# Altium footprint library STM32F0.PcbLib: 228 footprints (part 4 of 16)
Each footprint in its own frame and in the unit in brackets; x right, y up, seen from the top. Pads: shape width x height; smd on the part's side, far side on the other; paste and mask are expansions set on the pad; w line width, h text height; cw(c..) or ccw(c..) is an arc to the next point about the centre after c.
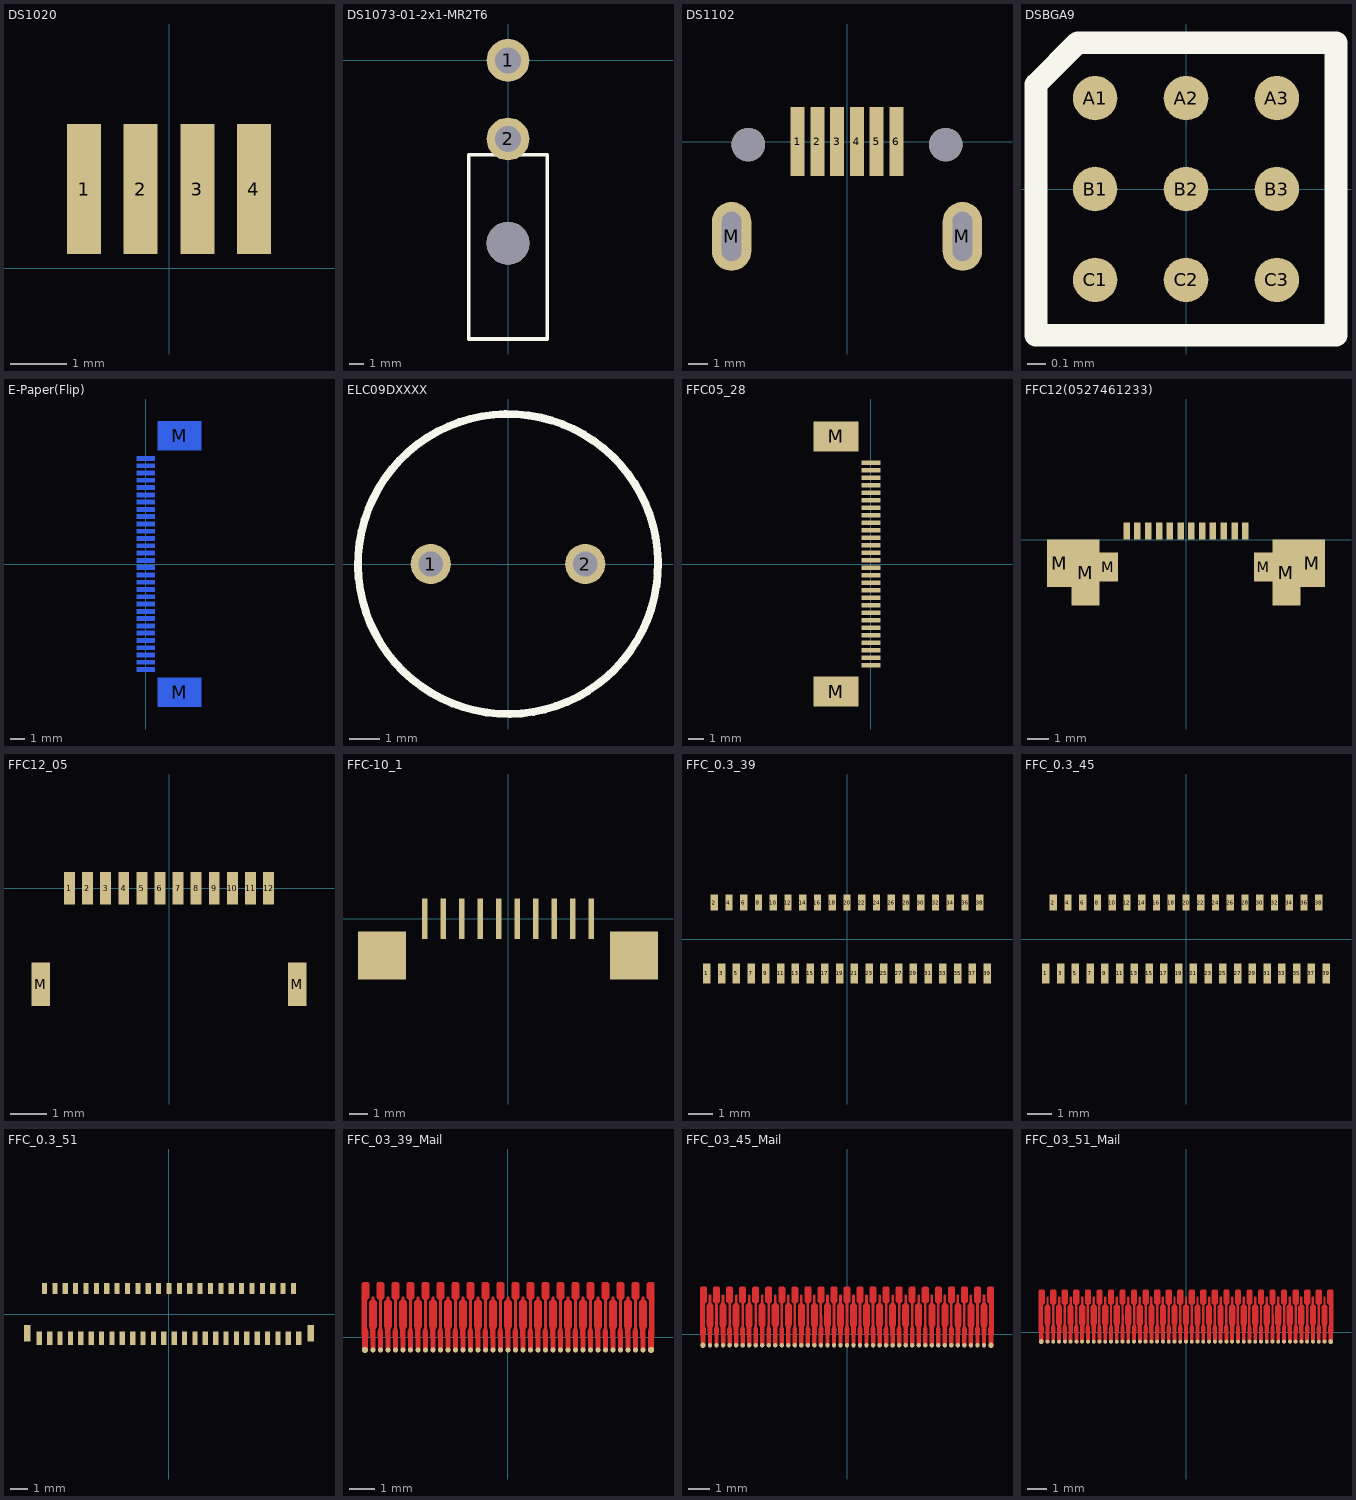
[diagram p3: the footprints below, top view; thin cyan lines are the x and y axes]

## DS1020 [mm]
pads (4):
  rect 0.6x2.3 smd: 1(-1.5,1.4) 2(-0.5,1.4) 3(0.5,1.4) 4(1.5,1.4)
3D body "DS1020.STEP": height 2.8, standoff 0, extent -3,-3.95 3,2.45

## DS1073-01-2x1-MR2T6 [mm]
pads (3):
  round 3 hole 1.8: 1(0,0) 2(0,-5.5)
  round 3 hole 3 unplated: ""(0,-12.8)
Top Overlay:
  lines w0.254: -2.75,-19.5 2.75,-19.5 2.75,-6.6 -2.75,-6.6 -2.75,-19.5

## DS1102 [mm]
pads (10):
  rect 0.7x3.5 smd: 1(-2.5,0) 2(-1.5,0) 3(-0.5,0) 4(0.5,0) 5(1.5,0) 6(2.5,0)
  oval 2x3.5 hole 1 slot 2.5 at 90 deg: M(-5.85,-4.8) M(5.85,-4.8)
  round 1.7 hole 1.7 unplated: ""(-5,-0.15) ""(5,-0.15)
3D body "53462-0629.stp": height 8.7, standoff -3.15, extent -6.75,-15.601 6.75,0.599

## DSBGA9 [mm]
pads (9):
  round 0.245 smd mask+0.05: A1(-0.5,0.5) A2(0,0.5) A3(0.5,0.5) B1(-0.5,0) B2(0,0) B3(0.5,0) C1(-0.5,-0.5) C2(0,-0.5) C3(0.5,-0.5)
Top Overlay:
  lines w0.125: -0.825,-0.805 -0.825,0.575 -0.595,0.805 0.825,0.805 0.825,-0.805 -0.825,-0.805

## E-Paper(Flip) [mm]
pads (32):
  rect 1.25x0.3 smd far side: 1(0,-7.25) 2(0,-6.75) 3(0,-6.25) 4(0,-5.75) 5(0,-5.25) 6(0,-4.75) 7(0,-4.25) 8(0,-3.75) 9(0,-3.25) 10(0,-2.75) 11(0,-2.25) 12(0,-1.75) 13(0,-1.25) 14(0,-0.75) 15(0,-0.25) 16(0,0.25) 17(0,0.75) 18(0,1.25) 19(0,1.75) 20(0,2.25) 21(0,2.75) 22(0,3.25) 23(0,3.75) 24(0,4.25) 25(0,4.75) 26(0,5.25) 27(0,5.75) 28(0,6.25) 29(0,6.75) 30(0,7.25)
  rect 3x2 smd far side: M(2.325,-8.8) M(2.325,8.8)
3D body "EPaperAsm1.STEP": height 1.48, standoff -2.23, extent -25.285,-9.3 8.225,9.3

## ELC09DXXXX [mm]
pads (2):
  round 1.3 hole 0.8: 1(-2.5,0) 2(2.5,0)
Top Overlay:
  lines w0.254: 4.857,0.099 ccw(c0,0) 4.858,0.05
3D body "User Library-COIL-ELC.step": height 8.9, standoff -3.1, extent -4.75,-4.75 4.75,4.75

## FFC05_28 [mm]
pads (30):
  rect 1.25x0.3 smd: 1(0,-6.75) 2(0,-6.25) 3(0,-5.75) 4(0,-5.25) 5(0,-4.75) 6(0,-4.25) 7(0,-3.75) 8(0,-3.25) 9(0,-2.75) 10(0,-2.25) 11(0,-1.75) 12(0,-1.25) 13(0,-0.75) 14(0,-0.25) 15(0,0.25) 16(0,0.75) 17(0,1.25) 18(0,1.75) 19(0,2.25) 20(0,2.75) 21(0,3.25) 22(0,3.75) 23(0,4.25) 24(0,4.75) 25(0,5.25) 26(0,5.75) 27(0,6.25) 28(0,6.75)
  rect 3x2 smd: M(-2.325,-8.52) M(-2.325,8.52)

## FFC12(0527461233) [mm] "Molex 0527461233"
pads (18):
  rect 0.3x0.8 smd: 1(-2.75,0.4) 2(-2.25,0.4) 3(-1.75,0.4) 4(-1.25,0.4) 5(-0.75,0.4) 6(-0.25,0.4) 7(0.25,0.4) 8(0.75,0.4) 9(1.25,0.4) 10(1.75,0.4) 11(2.25,0.4) 12(2.75,0.4)
  rect 1.2x2.2 smd: M(-5.85,-1.1) M(5.85,-1.1)
  rect 1.3x3.05 smd: M(-4.65,-1.525) M(4.65,-1.525)
  rect 0.9x1.34 smd: M(-3.6,-1.27) M(3.6,-1.27)
3D body "52746-1290.stp": height 2, standoff 0, extent -6.05,-5.9 6.05,0.7

## FFC12_05 [mm]
pads (14):
  rect 0.3x0.9 smd: 1(-2.75,0) 2(-2.25,0) 3(-1.75,0) 4(-1.25,0) 5(-0.75,0) 6(-0.25,0) 7(0.25,0) 8(0.75,0) 9(1.25,0) 10(1.75,0) 11(2.25,0) 12(2.75,0)
  rect 0.5x1.2 smd: M(-3.54,-2.65) M(3.54,-2.65)
3D body "5034801200.stp": height 1.85, standoff -0.02, extent -3.85,-3.25 3.85,0.35

## FFC-10_1 [mm]
pads (12):
  rect 0.3x2.2 smd: 1(-4.5,0) 2(-3.5,0) 3(-2.5,0) 4(-1.5,0) 5(-0.5,0) 6(0.5,0) 7(1.5,0) 8(2.5,0) 9(3.5,0) 10(4.5,0)
  rect 2.6x2.6 smd: ""(-6.8,-2) ""(6.8,-2)

## FFC_0.3_39 [mm]
pads (39):
  rect 0.3x0.8 smd: 1(-5.7,-1.4) 3(-5.1,-1.4) 5(-4.5,-1.4) 7(-3.9,-1.4) 9(-3.3,-1.4) 11(-2.7,-1.4) 13(-2.1,-1.4) 15(-1.5,-1.4) 17(-0.9,-1.4) 19(-0.3,-1.4) 21(0.3,-1.4) 23(0.9,-1.4) 25(1.5,-1.4) 27(2.1,-1.4) 29(2.7,-1.4) 31(3.3,-1.4) 33(3.9,-1.4) 35(4.5,-1.4) 37(5.1,-1.4) 39(5.7,-1.4)
  rect 0.3x0.65 smd: 2(-5.4,1.475) 4(-4.8,1.475) 6(-4.2,1.475) 8(-3.6,1.475) 10(-3,1.475) 12(-2.4,1.475) 14(-1.8,1.475) 16(-1.2,1.475) 18(-0.6,1.475) 20(0,1.475) 22(0.6,1.475) 24(1.2,1.475) 26(1.8,1.475) 28(2.4,1.475) 30(3,1.475) 32(3.6,1.475) 34(4.2,1.475) 36(4.8,1.475) 38(5.4,1.475)
3D body "5047403900.stp": height 1.62, standoff -0.03, extent -6.4,-1.7 6.4,1.75

## FFC_0.3_45 [mm]
pads (39):
  rect 0.3x0.8 smd: 1(-5.7,-1.4) 3(-5.1,-1.4) 5(-4.5,-1.4) 7(-3.9,-1.4) 9(-3.3,-1.4) 11(-2.7,-1.4) 13(-2.1,-1.4) 15(-1.5,-1.4) 17(-0.9,-1.4) 19(-0.3,-1.4) 21(0.3,-1.4) 23(0.9,-1.4) 25(1.5,-1.4) 27(2.1,-1.4) 29(2.7,-1.4) 31(3.3,-1.4) 33(3.9,-1.4) 35(4.5,-1.4) 37(5.1,-1.4) 39(5.7,-1.4)
  rect 0.3x0.65 smd: 2(-5.4,1.475) 4(-4.8,1.475) 6(-4.2,1.475) 8(-3.6,1.475) 10(-3,1.475) 12(-2.4,1.475) 14(-1.8,1.475) 16(-1.2,1.475) 18(-0.6,1.475) 20(0,1.475) 22(0.6,1.475) 24(1.2,1.475) 26(1.8,1.475) 28(2.4,1.475) 30(3,1.475) 32(3.6,1.475) 34(4.2,1.475) 36(4.8,1.475) 38(5.4,1.475)
3D body "5047403900.stp": height 1.62, standoff -0.03, extent -6.4,-1.7 6.4,1.75

## FFC_0.3_51 [mm]
pads (53):
  rect 0.3x0.8 smd: 1(-7.5,-1.4) 3(-6.9,-1.4) 5(-6.3,-1.4) 7(-5.7,-1.4) 9(-5.1,-1.4) 11(-4.5,-1.4) 13(-3.9,-1.4) 15(-3.3,-1.4) 17(-2.7,-1.4) 19(-2.1,-1.4) 21(-1.5,-1.4) 23(-0.9,-1.4) 25(-0.3,-1.4) 27(0.3,-1.4) 29(0.9,-1.4) 31(1.5,-1.4) 33(2.1,-1.4) 35(2.7,-1.4) 37(3.3,-1.4) 39(3.9,-1.4) 41(4.5,-1.4) 43(5.1,-1.4) 45(5.7,-1.4) 47(6.3,-1.4) 49(6.9,-1.4) 51(7.5,-1.4)
  rect 0.3x0.65 smd: 2(-7.2,1.475) 4(-6.6,1.475) 6(-6,1.475) 8(-5.4,1.475) 10(-4.8,1.475) 12(-4.2,1.475) 14(-3.6,1.475) 16(-3,1.475) 18(-2.4,1.475) 20(-1.8,1.475) 22(-1.2,1.475) 24(-0.6,1.475) 26(0,1.475) 28(0.6,1.475) 30(1.2,1.475) 32(1.8,1.475) 34(2.4,1.475) 36(3,1.475) 38(3.6,1.475) 40(4.2,1.475) 42(4.8,1.475) 44(5.4,1.475) 46(6,1.475) 48(6.6,1.475) 50(7.2,1.475)
  rect 0.4x0.95 smd: M(-8.2,-1.125) M(8.2,-1.125)
3D body "fh26w-51s-0_3shw_99_.stp": height 1.01, standoff 0.01, extent -8.4,-1.905 8.4,1.595

## FFC_03_39_Mail [mm]
pads (39):
  round 0.25 smd paste-1: 1(5.725,-0.5)
  round 0.2 smd paste-1: 2(5.4,-0.5) 3(5.1,-0.5) 4(4.8,-0.5) 5(4.5,-0.5) 6(4.2,-0.5) 7(3.9,-0.5) 8(3.6,-0.5) 9(3.3,-0.5) 10(3,-0.5) 11(2.7,-0.5) 12(2.4,-0.5) 13(2.1,-0.5) 14(1.8,-0.5) 15(1.5,-0.5) 16(1.2,-0.5) 17(0.9,-0.5) 18(0.6,-0.5) 19(0.3,-0.5) 20(0,-0.5) 21(-0.3,-0.5) 22(-0.6,-0.5) 23(-0.9,-0.5) 24(-1.2,-0.5) 25(-1.5,-0.5) 26(-1.8,-0.5) 27(-2.1,-0.5) 28(-2.4,-0.5) 29(-2.7,-0.5) 30(-3,-0.5) 31(-3.3,-0.5) 32(-3.6,-0.5) 33(-3.9,-0.5) 34(-4.2,-0.5) 35(-4.5,-0.5) 36(-4.8,-0.5) 37(-5.1,-0.5) 38(-5.4,-0.5)
  round 0.25 smd paste-10: 39(-5.725,-0.5)
Top Layer:
  region: -5,0 -5.2,0 -5.2,0.25 -5.15,0.4 -5.15,1.48 -5.25,1.58 -5.25,2.15 -5.2,2.2 -5,2.2 -4.95,2.15 -4.95,1.58 -5.05,1.48 -5.05,0.4 -5,0.25
  region: -4.4,0 -4.6,0 -4.6,0.25 -4.55,0.4 -4.55,1.48 -4.65,1.58 -4.65,2.15 -4.6,2.2 -4.4,2.2 -4.35,2.15 -4.35,1.58 -4.45,1.48 -4.45,0.4 -4.4,0.25
  region: -3.8,0 -4,0 -4,0.25 -3.95,0.4 -3.95,1.48 -4.05,1.58 -4.05,2.15 -4,2.2 -3.8,2.2 -3.75,2.15 -3.75,1.58 -3.85,1.48 -3.85,0.4 -3.8,0.25
  region: -0.8,0 -1,0 -1,0.25 -0.95,0.4 -0.95,1.48 -1.05,1.58 -1.05,2.15 -1,2.2 -0.8,2.2 -0.75,2.15 -0.75,1.58 -0.85,1.48 -0.85,0.4 -0.8,0.25
  region: -1.4,0 -1.6,0 -1.6,0.25 -1.55,0.4 -1.55,1.48 -1.65,1.58 -1.65,2.15 -1.6,2.2 -1.4,2.2 -1.35,2.15 -1.35,1.58 -1.45,1.48 -1.45,0.4 -1.4,0.25
  region: -2,0 -2.2,0 -2.2,0.25 -2.15,0.4 -2.15,1.48 -2.25,1.58 -2.25,2.15 -2.2,2.2 -2,2.2 -1.95,2.15 -1.95,1.58 -2.05,1.48 -2.05,0.4 -2,0.25
  region: -2.6,0 -2.8,0 -2.8,0.25 -2.75,0.4 -2.75,1.48 -2.85,1.58 -2.85,2.15 -2.8,2.2 -2.6,2.2 -2.55,2.15 -2.55,1.58 -2.65,1.48 -2.65,0.4 -2.6,0.25
  region: -3.2,0 -3.4,0 -3.4,0.25 -3.35,0.4 -3.35,1.48 -3.45,1.58 -3.45,2.15 -3.4,2.2 -3.2,2.2 -3.15,2.15 -3.15,1.58 -3.25,1.48 -3.25,0.4 -3.2,0.25
  region: 2.2,0 2,0 2,0.25 2.05,0.4 2.05,1.48 1.95,1.58 1.95,2.15 2,2.2 2.2,2.2 2.25,2.15 2.25,1.58 2.15,1.48 2.15,0.4 2.2,0.25
  region: 1.6,0 1.4,0 1.4,0.25 1.45,0.4 1.45,1.48 1.35,1.58 1.35,2.15 1.4,2.2 1.6,2.2 1.65,2.15 1.65,1.58 1.55,1.48 1.55,0.4 1.6,0.25
  region: 1,0 0.8,0 0.8,0.25 0.85,0.4 0.85,1.48 0.75,1.58 0.75,2.15 0.8,2.2 1,2.2 1.05,2.15 1.05,1.58 0.95,1.48 0.95,0.4 1,0.25
  region: 0.4,0 0.2,0 0.2,0.25 0.25,0.4 0.25,1.48 0.15,1.58 0.15,2.15 0.2,2.2 0.4,2.2 0.45,2.15 0.45,1.58 0.35,1.48 0.35,0.4 0.4,0.25
  region: -0.2,0 -0.4,0 -0.4,0.25 -0.35,0.4 -0.35,1.48 -0.45,1.58 -0.45,2.15 -0.4,2.2 -0.2,2.2 -0.15,2.15 -0.15,1.58 -0.25,1.48 -0.25,0.4 -0.2,0.25
  region: 2.8,0 2.6,0 2.6,0.25 2.65,0.4 2.65,1.48 2.55,1.58 2.55,2.15 2.6,2.2 2.8,2.2 2.85,2.15 2.85,1.58 2.75,1.48 2.75,0.4 2.8,0.25
  region: 3.4,0 3.2,0 3.2,0.25 3.25,0.4 3.25,1.48 3.15,1.58 3.15,2.15 3.2,2.2 3.4,2.2 3.45,2.15 3.45,1.58 3.35,1.48 3.35,0.4 3.4,0.25
  region: 4,0 3.8,0 3.8,0.25 3.85,0.4 3.85,1.48 3.75,1.58 3.75,2.15 3.8,2.2 4,2.2 4.05,2.15 4.05,1.58 3.95,1.48 3.95,0.4 4,0.25
  region: 4.6,0 4.4,0 4.4,0.25 4.45,0.4 4.45,1.48 4.35,1.58 4.35,2.15 4.4,2.2 4.6,2.2 4.65,2.15 4.65,1.58 4.55,1.48 4.55,0.4 4.6,0.25
  region: 4.7,0 4.7,0.3 4.65,0.45 4.65,1.43 4.75,1.53 4.75,1.61 4.77,1.63 4.83,1.63 4.85,1.61 4.85,1.53 4.95,1.43 4.95,0.45 4.9,0.3 4.9,0
  region: 4.1,0 4.1,0.3 4.05,0.45 4.05,1.43 4.15,1.53 4.15,1.61 4.17,1.63 4.23,1.63 4.25,1.61 4.25,1.53 4.35,1.43 4.35,0.45 4.3,0.3 4.3,0
  region: -0.7,0 -0.7,0.3 -0.75,0.45 -0.75,1.43 -0.65,1.53 -0.65,1.61 -0.63,1.63 -0.57,1.63 -0.55,1.61 -0.55,1.53 -0.45,1.43 -0.45,0.45 -0.5,0.3 -0.5,0
  region: -0.1,0 -0.1,0.3 -0.15,0.45 -0.15,1.43 -0.05,1.53 -0.05,1.61 -0.03,1.63 0.03,1.63 0.05,1.61 0.05,1.53 0.15,1.43 0.15,0.45 0.1,0.3 0.1,0
  region: 0.5,0 0.5,0.3 0.45,0.45 0.45,1.43 0.55,1.53 0.55,1.61 0.57,1.63 0.63,1.63 0.65,1.61 0.65,1.53 0.75,1.43 0.75,0.45 0.7,0.3 0.7,0
  region: 1.1,0 1.1,0.3 1.05,0.45 1.05,1.43 1.15,1.53 1.15,1.61 1.17,1.63 1.23,1.63 1.25,1.61 1.25,1.53 1.35,1.43 1.35,0.45 1.3,0.3 1.3,0
  region: 1.7,0 1.7,0.3 1.65,0.45 1.65,1.43 1.75,1.53 1.75,1.61 1.77,1.63 1.83,1.63 1.85,1.61 1.85,1.53 1.95,1.43 1.95,0.45 1.9,0.3 1.9,0
  region: 2.3,0 2.3,0.3 2.25,0.45 2.25,1.43 2.35,1.53 2.35,1.61 2.37,1.63 2.43,1.63 2.45,1.61 2.45,1.53 2.55,1.43 2.55,0.45 2.5,0.3 2.5,0
  region: 2.9,0 2.9,0.3 2.85,0.45 2.85,1.43 2.95,1.53 2.95,1.61 2.97,1.63 3.03,1.63 3.05,1.61 3.05,1.53 3.15,1.43 3.15,0.45 3.1,0.3 3.1,0
  region: 3.5,0 3.5,0.3 3.45,0.45 3.45,1.43 3.55,1.53 3.55,1.61 3.57,1.63 3.63,1.63 3.65,1.61 3.65,1.53 3.75,1.43 3.75,0.45 3.7,0.3 3.7,0
  region: -1.3,0 -1.3,0.3 -1.35,0.45 -1.35,1.43 -1.25,1.53 -1.25,1.61 -1.23,1.63 -1.17,1.63 -1.15,1.61 -1.15,1.53 -1.05,1.43 -1.05,0.45 -1.1,0.3 -1.1,0
  region: -1.9,0 -1.9,0.3 -1.95,0.45 -1.95,1.43 -1.85,1.53 -1.85,1.61 -1.83,1.63 -1.77,1.63 -1.75,1.61 -1.75,1.53 -1.65,1.43 -1.65,0.45 -1.7,0.3 -1.7,0
  region: -2.5,0 -2.5,0.3 -2.55,0.45 -2.55,1.43 -2.45,1.53 -2.45,1.61 -2.43,1.63 -2.37,1.63 -2.35,1.61 -2.35,1.53 -2.25,1.43 -2.25,0.45 -2.3,0.3 -2.3,0
  region: -3.1,0 -3.1,0.3 -3.15,0.45 -3.15,1.43 -3.05,1.53 -3.05,1.61 -3.03,1.63 -2.97,1.63 -2.95,1.61 -2.95,1.53 -2.85,1.43 -2.85,0.45 -2.9,0.3 -2.9,0
  region: -3.7,0 -3.7,0.3 -3.75,0.45 -3.75,1.43 -3.65,1.53 -3.65,1.61 -3.63,1.63 -3.57,1.63 -3.55,1.61 -3.55,1.53 -3.45,1.43 -3.45,0.45 -3.5,0.3 -3.5,0
  region: -4.3,0 -4.3,0.3 -4.35,0.45 -4.35,1.43 -4.25,1.53 -4.25,1.61 -4.23,1.63 -4.17,1.63 -4.15,1.61 -4.15,1.53 -4.05,1.43 -4.05,0.45 -4.1,0.3 -4.1,0
  region: -4.9,0 -4.9,0.3 -4.95,0.45 -4.95,1.43 -4.85,1.53 -4.85,1.61 -4.83,1.63 -4.77,1.63 -4.75,1.61 -4.75,1.53 -4.65,1.43 -4.65,0.45 -4.7,0.3 -4.7,0
  region: -5.5,0 -5.5,0.3 -5.55,0.45 -5.55,1.43 -5.45,1.53 -5.45,1.61 -5.43,1.63 -5.37,1.63 -5.35,1.61 -5.35,1.53 -5.25,1.43 -5.25,0.45 -5.3,0.3 -5.3,0
  region: 5.6,0 5.6,0.25 5.65,0.4 5.65,1.48 5.55,1.58 5.55,2.15 5.6,2.2 5.8,2.2 5.85,2.15 5.85,0
  region: 5.3,0 5.3,0.3 5.25,0.45 5.25,1.43 5.35,1.53 5.35,1.61 5.37,1.63 5.43,1.63 5.45,1.61 5.45,1.53 5.55,1.43 5.55,0.45 5.5,0.3 5.5,0
  region: 5.2,0 5,0 5,0.25 5.05,0.4 5.05,1.48 4.95,1.58 4.95,2.15 5,2.2 5.2,2.2 5.25,2.15 5.25,1.58 5.15,1.48 5.15,0.4 5.2,0.25
  region: -5.6,0 -5.85,0 -5.85,2.15 -5.8,2.2 -5.6,2.2 -5.55,2.15 -5.55,1.58 -5.65,1.48 -5.65,0.4 -5.6,0.25
  lines w0.2: -5.4,-0.5 -5.4,0 ; -5.1,-0.5 -5.1,0 ; -4.8,-0.5 -4.8,0 ; -4.5,-0.5 -4.5,0 ; -4.2,-0.5 -4.2,0 ; -3.9,-0.5 -3.9,0 ; -3.6,-0.5 -3.6,0 ; -3.3,-0.5 -3.3,0 ; -3,-0.5 -3,0 ; -2.7,-0.5 -2.7,0 ; -2.4,-0.5 -2.4,0 ; -2.1,-0.5 -2.1,0 ; -1.8,-0.5 -1.8,0 ; -1.5,-0.5 -1.5,0 ; -1.2,-0.5 -1.2,0 ; -0.9,-0.5 -0.9,0 ; -0.6,-0.5 -0.6,0 ; -0.3,-0.5 -0.3,0 ; 0,-0.5 0,0 ; 0.3,-0.5 0.3,0 ; 0.6,-0.5 0.6,0 ; 0.9,-0.5 0.9,0 ; 1.2,-0.5 1.2,0 ; 1.5,-0.5 1.5,0 ; 1.8,-0.5 1.8,0 ; 2.1,-0.5 2.1,0 ; 2.4,-0.5 2.4,0 ; 2.7,-0.5 2.7,0 ; 3,-0.5 3,0 ; 3.3,-0.5 3.3,0 ; 3.6,-0.5 3.6,0 ; 3.9,-0.5 3.9,0 ; 4.2,-0.5 4.2,0 ; 4.5,-0.5 4.5,0 ; 4.8,-0.5 4.8,0 ; 5.1,-0.5 5.1,0 ; 5.4,-0.5 5.4,0
  lines w0.25: -5.725,-0.5 -5.725,0 ; 5.725,-0.5 5.725,0
Top Solder:
  rectangle: -6,0 6,2.5

## FFC_03_45_Mail [mm]
pads (45):
  round 0.25 smd paste-1: 1(6.625,-0.5)
  round 0.2 smd paste-1: 2(6.3,-0.5) 3(6,-0.5) 4(5.7,-0.5) 5(5.4,-0.5) 6(5.1,-0.5) 7(4.8,-0.5) 8(4.5,-0.5) 9(4.2,-0.5) 10(3.9,-0.5) 11(3.6,-0.5) 12(3.3,-0.5) 13(3,-0.5) 14(2.7,-0.5) 15(2.4,-0.5) 16(2.1,-0.5) 17(1.8,-0.5) 18(1.5,-0.5) 19(1.2,-0.5) 20(0.9,-0.5) 21(0.6,-0.5) 22(0.3,-0.5) 23(0,-0.5) 24(-0.3,-0.5) 25(-0.6,-0.5) 26(-0.9,-0.5) 27(-1.2,-0.5) 28(-1.5,-0.5) 29(-1.8,-0.5) 30(-2.1,-0.5) 31(-2.4,-0.5) 32(-2.7,-0.5) 33(-3,-0.5) 34(-3.3,-0.5) 35(-3.6,-0.5) 36(-3.9,-0.5) 37(-4.2,-0.5) 38(-4.5,-0.5) 39(-4.8,-0.5) 40(-5.1,-0.5) 41(-5.4,-0.5) 42(-5.7,-0.5) 43(-6,-0.5) 44(-6.3,-0.5)
  round 0.25 smd paste-10: 45(-6.625,-0.5)
Top Layer:
  region: 6.5,0 6.5,0.25 6.55,0.4 6.55,1.4 6.45,1.5 6.45,2.15 6.5,2.2 6.7,2.2 6.75,2.15 6.75,0
  region: -1.7,0 -1.9,0 -1.9,0.25 -1.85,0.4 -1.85,1.4 -1.95,1.5 -1.95,2.15 -1.9,2.2 -1.7,2.2 -1.65,2.15 -1.65,1.5 -1.75,1.4 -1.75,0.4 -1.7,0.25
  region: 6.2,0 6.2,0.3 6.15,0.45 6.15,1.35 6.25,1.45 6.25,1.8 6.275,1.825 6.325,1.825 6.35,1.8 6.35,1.45 6.45,1.35 6.45,0.45 6.4,0.3 6.4,0
  region: 5.6,0 5.6,0.3 5.55,0.45 5.55,1.35 5.65,1.45 5.65,1.8 5.675,1.825 5.725,1.825 5.75,1.8 5.75,1.45 5.85,1.35 5.85,0.45 5.8,0.3 5.8,0
  region: 5,0 5,0.3 4.95,0.45 4.95,1.35 5.05,1.45 5.05,1.8 5.075,1.825 5.125,1.825 5.15,1.8 5.15,1.45 5.25,1.35 5.25,0.45 5.2,0.3 5.2,0
  region: 4.4,0 4.4,0.3 4.35,0.45 4.35,1.35 4.45,1.45 4.45,1.8 4.475,1.825 4.525,1.825 4.55,1.8 4.55,1.45 4.65,1.35 4.65,0.45 4.6,0.3 4.6,0
  region: 3.8,0 3.8,0.3 3.75,0.45 3.75,1.35 3.85,1.45 3.85,1.8 3.875,1.825 3.925,1.825 3.95,1.8 3.95,1.45 4.05,1.35 4.05,0.45 4,0.3 4,0
  region: 3.2,0 3.2,0.3 3.15,0.45 3.15,1.35 3.25,1.45 3.25,1.8 3.275,1.825 3.325,1.825 3.35,1.8 3.35,1.45 3.45,1.35 3.45,0.45 3.4,0.3 3.4,0
  region: 3.1,0 2.9,0 2.9,0.25 2.95,0.4 2.95,1.4 2.85,1.5 2.85,2.15 2.9,2.2 3.1,2.2 3.15,2.15 3.15,1.5 3.05,1.4 3.05,0.4 3.1,0.25
  region: 3.7,0 3.5,0 3.5,0.25 3.55,0.4 3.55,1.4 3.45,1.5 3.45,2.15 3.5,2.2 3.7,2.2 3.75,2.15 3.75,1.5 3.65,1.4 3.65,0.4 3.7,0.25
  region: 6.1,0 5.9,0 5.9,0.25 5.95,0.4 5.95,1.4 5.85,1.5 5.85,2.15 5.9,2.2 6.1,2.2 6.15,2.15 6.15,1.5 6.05,1.4 6.05,0.4 6.1,0.25
  region: 5.5,0 5.3,0 5.3,0.25 5.35,0.4 5.35,1.4 5.25,1.5 5.25,2.15 5.3,2.2 5.5,2.2 5.55,2.15 5.55,1.5 5.45,1.4 5.45,0.4 5.5,0.25
  region: 4.9,0 4.7,0 4.7,0.25 4.75,0.4 4.75,1.4 4.65,1.5 4.65,2.15 4.7,2.2 4.9,2.2 4.95,2.15 4.95,1.5 4.85,1.4 4.85,0.4 4.9,0.25
  region: 4.3,0 4.1,0 4.1,0.25 4.15,0.4 4.15,1.4 4.05,1.5 4.05,2.15 4.1,2.2 4.3,2.2 4.35,2.15 4.35,1.5 4.25,1.4 4.25,0.4 4.3,0.25
  region: 0.7,0 0.5,0 0.5,0.25 0.55,0.4 0.55,1.4 0.45,1.5 0.45,2.15 0.5,2.2 0.7,2.2 0.75,2.15 0.75,1.5 0.65,1.4 0.65,0.4 0.7,0.25
  region: 1.3,0 1.1,0 1.1,0.25 1.15,0.4 1.15,1.4 1.05,1.5 1.05,2.15 1.1,2.2 1.3,2.2 1.35,2.15 1.35,1.5 1.25,1.4 1.25,0.4 1.3,0.25
  region: 1.9,0 1.7,0 1.7,0.25 1.75,0.4 1.75,1.4 1.65,1.5 1.65,2.15 1.7,2.2 1.9,2.2 1.95,2.15 1.95,1.5 1.85,1.4 1.85,0.4 1.9,0.25
  region: 2.5,0 2.3,0 2.3,0.25 2.35,0.4 2.35,1.4 2.25,1.5 2.25,2.15 2.3,2.2 2.5,2.2 2.55,2.15 2.55,1.5 2.45,1.4 2.45,0.4 2.5,0.25
  region: 0.1,0 -0.1,0 -0.1,0.25 -0.05,0.4 -0.05,1.4 -0.15,1.5 -0.15,2.15 -0.1,2.2 0.1,2.2 0.15,2.15 0.15,1.5 0.05,1.4 0.05,0.4 0.1,0.25
  region: -0.5,0 -0.7,0 -0.7,0.25 -0.65,0.4 -0.65,1.4 -0.75,1.5 -0.75,2.15 -0.7,2.2 -0.5,2.2 -0.45,2.15 -0.45,1.5 -0.55,1.4 -0.55,0.4 -0.5,0.25
  region: -1.1,0 -1.3,0 -1.3,0.25 -1.25,0.4 -1.25,1.4 -1.35,1.5 -1.35,2.15 -1.3,2.2 -1.1,2.2 -1.05,2.15 -1.05,1.5 -1.15,1.4 -1.15,0.4 -1.1,0.25
  region: -1,0 -1,0.3 -1.05,0.45 -1.05,1.35 -0.95,1.45 -0.95,1.8 -0.925,1.825 -0.875,1.825 -0.85,1.8 -0.85,1.45 -0.75,1.35 -0.75,0.45 -0.8,0.3 -0.8,0
  region: -0.4,0 -0.4,0.3 -0.45,0.45 -0.45,1.35 -0.35,1.45 -0.35,1.8 -0.325,1.825 -0.275,1.825 -0.25,1.8 -0.25,1.45 -0.15,1.35 -0.15,0.45 -0.2,0.3 -0.2,0
  region: 0.2,0 0.2,0.3 0.15,0.45 0.15,1.35 0.25,1.45 0.25,1.8 0.275,1.825 0.325,1.825 0.35,1.8 0.35,1.45 0.45,1.35 0.45,0.45 0.4,0.3 0.4,0
  region: 0.8,0 0.8,0.3 0.75,0.45 0.75,1.35 0.85,1.45 0.85,1.8 0.875,1.825 0.925,1.825 0.95,1.8 0.95,1.45 1.05,1.35 1.05,0.45 1,0.3 1,0
  region: 1.4,0 1.4,0.3 1.35,0.45 1.35,1.35 1.45,1.45 1.45,1.8 1.475,1.825 1.525,1.825 1.55,1.8 1.55,1.45 1.65,1.35 1.65,0.45 1.6,0.3 1.6,0
  region: 2,0 2,0.3 1.95,0.45 1.95,1.35 2.05,1.45 2.05,1.8 2.075,1.825 2.125,1.825 2.15,1.8 2.15,1.45 2.25,1.35 2.25,0.45 2.2,0.3 2.2,0
  region: 2.6,0 2.6,0.3 2.55,0.45 2.55,1.35 2.65,1.45 2.65,1.8 2.675,1.825 2.725,1.825 2.75,1.8 2.75,1.45 2.85,1.35 2.85,0.45 2.8,0.3 2.8,0
  region: -1.6,0 -1.6,0.3 -1.65,0.45 -1.65,1.35 -1.55,1.45 -1.55,1.8 -1.525,1.825 -1.475,1.825 -1.45,1.8 -1.45,1.45 -1.35,1.35 -1.35,0.45 -1.4,0.3 -1.4,0
  region: -4.1,0 -4.3,0 -4.3,0.25 -4.25,0.4 -4.25,1.4 -4.35,1.5 -4.35,2.15 -4.3,2.2 -4.1,2.2 -4.05,2.15 -4.05,1.5 -4.15,1.4 -4.15,0.4 -4.1,0.25
  region: -3.5,0 -3.7,0 -3.7,0.25 -3.65,0.4 -3.65,1.4 -3.75,1.5 -3.75,2.15 -3.7,2.2 -3.5,2.2 -3.45,2.15 -3.45,1.5 -3.55,1.4 -3.55,0.4 -3.5,0.25
  region: -2.9,0 -3.1,0 -3.1,0.25 -3.05,0.4 -3.05,1.4 -3.15,1.5 -3.15,2.15 -3.1,2.2 -2.9,2.2 -2.85,2.15 -2.85,1.5 -2.95,1.4 -2.95,0.4 -2.9,0.25
  region: -2.3,0 -2.5,0 -2.5,0.25 -2.45,0.4 -2.45,1.4 -2.55,1.5 -2.55,2.15 -2.5,2.2 -2.3,2.2 -2.25,2.15 -2.25,1.5 -2.35,1.4 -2.35,0.4 -2.3,0.25
  region: -4.7,0 -4.9,0 -4.9,0.25 -4.85,0.4 -4.85,1.4 -4.95,1.5 -4.95,2.15 -4.9,2.2 -4.7,2.2 -4.65,2.15 -4.65,1.5 -4.75,1.4 -4.75,0.4 -4.7,0.25
  region: -5.3,0 -5.5,0 -5.5,0.25 -5.45,0.4 -5.45,1.4 -5.55,1.5 -5.55,2.15 -5.5,2.2 -5.3,2.2 -5.25,2.15 -5.25,1.5 -5.35,1.4 -5.35,0.4 -5.3,0.25
  region: -5.9,0 -6.1,0 -6.1,0.25 -6.05,0.4 -6.05,1.4 -6.15,1.5 -6.15,2.15 -6.1,2.2 -5.9,2.2 -5.85,2.15 -5.85,1.5 -5.95,1.4 -5.95,0.4 -5.9,0.25
  region: -5.8,0 -5.8,0.3 -5.85,0.45 -5.85,1.35 -5.75,1.45 -5.75,1.8 -5.725,1.825 -5.675,1.825 -5.65,1.8 -5.65,1.45 -5.55,1.35 -5.55,0.45 -5.6,0.3 -5.6,0
  region: -5.2,0 -5.2,0.3 -5.25,0.45 -5.25,1.35 -5.15,1.45 -5.15,1.8 -5.125,1.825 -5.075,1.825 -5.05,1.8 -5.05,1.45 -4.95,1.35 -4.95,0.45 -5,0.3 -5,0
  region: -4.6,0 -4.6,0.3 -4.65,0.45 -4.65,1.35 -4.55,1.45 -4.55,1.8 -4.525,1.825 -4.475,1.825 -4.45,1.8 -4.45,1.45 -4.35,1.35 -4.35,0.45 -4.4,0.3 -4.4,0
  region: -4,0 -4,0.3 -4.05,0.45 -4.05,1.35 -3.95,1.45 -3.95,1.8 -3.925,1.825 -3.875,1.825 -3.85,1.8 -3.85,1.45 -3.75,1.35 -3.75,0.45 -3.8,0.3 -3.8,0
  region: -3.4,0 -3.4,0.3 -3.45,0.45 -3.45,1.35 -3.35,1.45 -3.35,1.8 -3.325,1.825 -3.275,1.825 -3.25,1.8 -3.25,1.45 -3.15,1.35 -3.15,0.45 -3.2,0.3 -3.2,0
  region: -2.8,0 -2.8,0.3 -2.85,0.45 -2.85,1.35 -2.75,1.45 -2.75,1.8 -2.725,1.825 -2.675,1.825 -2.65,1.8 -2.65,1.45 -2.55,1.35 -2.55,0.45 -2.6,0.3 -2.6,0
  region: -2.2,0 -2.2,0.3 -2.25,0.45 -2.25,1.35 -2.15,1.45 -2.15,1.8 -2.125,1.825 -2.075,1.825 -2.05,1.8 -2.05,1.45 -1.95,1.35 -1.95,0.45 -2,0.3 -2,0
  region: -6.4,0 -6.4,0.3 -6.45,0.45 -6.45,1.35 -6.35,1.45 -6.35,1.8 -6.325,1.825 -6.275,1.825 -6.25,1.8 -6.25,1.45 -6.15,1.35 -6.15,0.45 -6.2,0.3 -6.2,0
  region: -6.5,0 -6.75,0 -6.75,2.15 -6.7,2.2 -6.5,2.2 -6.45,2.15 -6.45,1.5 -6.55,1.4 -6.55,0.4 -6.5,0.25
  lines w0.2: -6.3,-0.5 -6.3,0 ; -6,-0.5 -6,0 ; -5.7,-0.5 -5.7,0 ; -5.4,-0.5 -5.4,0 ; -5.1,-0.5 -5.1,0 ; -4.8,-0.5 -4.8,0 ; -4.5,-0.5 -4.5,0 ; -4.2,-0.5 -4.2,0 ; -3.9,-0.5 -3.9,0 ; -3.6,-0.5 -3.6,0 ; -3.3,-0.5 -3.3,0 ; -3,-0.5 -3,0 ; -2.7,-0.5 -2.7,0 ; -2.4,-0.5 -2.4,0 ; -2.1,-0.5 -2.1,0 ; -1.8,-0.5 -1.8,0 ; -1.5,-0.5 -1.5,0 ; -1.2,-0.5 -1.2,0 ; -0.9,-0.5 -0.9,0 ; -0.6,-0.5 -0.6,0 ; -0.3,-0.5 -0.3,0 ; 0,-0.5 0,0 ; 0.3,-0.5 0.3,0 ; 0.6,-0.5 0.6,0 ; 0.9,-0.5 0.9,0 ; 1.2,-0.5 1.2,0 ; 1.5,-0.5 1.5,0 ; 1.8,-0.5 1.8,0 ; 2.1,-0.5 2.1,0 ; 2.4,-0.5 2.4,0 ; 2.7,-0.5 2.7,0 ; 3,-0.5 3,0 ; 3.3,-0.5 3.3,0 ; 3.6,-0.5 3.6,0 ; 3.9,-0.5 3.9,0 ; 4.2,-0.5 4.2,0 ; 4.5,-0.5 4.5,0 ; 4.8,-0.5 4.8,0 ; 5.1,-0.5 5.1,0 ; 5.4,-0.5 5.4,0 ; 5.7,-0.5 5.7,0 ; 6,-0.5 6,0 ; 6.3,-0.5 6.3,0
  lines w0.25: -6.625,-0.5 -6.625,0 ; 6.625,-0.5 6.625,0
Top Solder:
  rectangle: -6.9,0 6.9,2.5

## FFC_03_51_Mail [mm]
pads (51):
  round 0.254 smd paste-1: 1(7.525,-0.5)
  round 0.2 smd paste-1: 2(7.2,-0.5) 3(6.9,-0.5) 4(6.6,-0.5) 5(6.3,-0.5) 6(6,-0.5) 7(5.7,-0.5) 8(5.4,-0.5) 9(5.1,-0.5) 10(4.8,-0.5) 11(4.5,-0.5) 12(4.2,-0.5) 13(3.9,-0.5) 14(3.6,-0.5) 15(3.3,-0.5) 16(3,-0.5) 17(2.7,-0.5) 18(2.4,-0.5) 19(2.1,-0.5) 20(1.8,-0.5) 21(1.5,-0.5) 22(1.2,-0.5) 23(0.9,-0.5) 24(0.6,-0.5) 25(0.3,-0.5) 26(0,-0.5) 27(-0.3,-0.5) 28(-0.6,-0.5) 29(-0.9,-0.5) 30(-1.2,-0.5) 31(-1.5,-0.5) 32(-1.8,-0.5) 33(-2.1,-0.5) 34(-2.4,-0.5) 35(-2.7,-0.5) 36(-3,-0.5) 37(-3.3,-0.5) 38(-3.6,-0.5) 39(-3.9,-0.5) 40(-4.2,-0.5) 41(-4.5,-0.5) 42(-4.8,-0.5) 43(-5.1,-0.5) 44(-5.4,-0.5) 45(-5.7,-0.5) 46(-6,-0.5) 47(-6.3,-0.5) 48(-6.6,-0.5) 49(-6.9,-0.5) 50(-7.2,-0.5)
  round 0.254 smd paste-10: 51(-7.525,-0.5)
Top Layer:
  region: 7.1,0 7.1,0.3 7.05,0.45 7.05,1.35 7.15,1.45 7.15,1.8 7.175,1.825 7.225,1.825 7.25,1.8 7.25,1.45 7.35,1.35 7.35,0.45 7.3,0.3 7.3,0
  region: 7,0 6.8,0 6.8,0.25 6.85,0.4 6.85,1.4 6.75,1.5 6.75,2.15 6.8,2.2 7,2.2 7.05,2.15 7.05,1.5 6.95,1.4 6.95,0.4 7,0.25
  region: 7.4,0 7.4,0.25 7.45,0.4 7.45,1.4 7.35,1.5 7.35,2.15 7.4,2.2 7.6,2.2 7.65,2.15 7.65,0
  region: -7.4,0 -7.65,0 -7.65,2.15 -7.6,2.2 -7.4,2.2 -7.35,2.15 -7.35,1.5 -7.45,1.4 -7.45,0.4 -7.4,0.25
  region: 6.4,0 6.2,0 6.2,0.25 6.25,0.4 6.25,1.4 6.15,1.5 6.15,2.15 6.2,2.2 6.4,2.2 6.45,2.15 6.45,1.5 6.35,1.4 6.35,0.4 6.4,0.25
  region: 5.8,0 5.6,0 5.6,0.25 5.65,0.4 5.65,1.4 5.55,1.5 5.55,2.15 5.6,2.2 5.8,2.2 5.85,2.15 5.85,1.5 5.75,1.4 5.75,0.4 5.8,0.25
  region: 5.2,0 5,0 5,0.25 5.05,0.4 5.05,1.4 4.95,1.5 4.95,2.15 5,2.2 5.2,2.2 5.25,2.15 5.25,1.5 5.15,1.4 5.15,0.4 5.2,0.25
  region: 4.6,0 4.4,0 4.4,0.25 4.45,0.4 4.45,1.4 4.35,1.5 4.35,2.15 4.4,2.2 4.6,2.2 4.65,2.15 4.65,1.5 4.55,1.4 4.55,0.4 4.6,0.25
  region: 4,0 3.8,0 3.8,0.25 3.85,0.4 3.85,1.4 3.75,1.5 3.75,2.15 3.8,2.2 4,2.2 4.05,2.15 4.05,1.5 3.95,1.4 3.95,0.4 4,0.25
  region: 3.4,0 3.2,0 3.2,0.25 3.25,0.4 3.25,1.4 3.15,1.5 3.15,2.15 3.2,2.2 3.4,2.2 3.45,2.15 3.45,1.5 3.35,1.4 3.35,0.4 3.4,0.25
  region: -0.8,0 -1,0 -1,0.25 -0.95,0.4 -0.95,1.4 -1.05,1.5 -1.05,2.15 -1,2.2 -0.8,2.2 -0.75,2.15 -0.75,1.5 -0.85,1.4 -0.85,0.4 -0.8,0.25
  region: -0.2,0 -0.4,0 -0.4,0.25 -0.35,0.4 -0.35,1.4 -0.45,1.5 -0.45,2.15 -0.4,2.2 -0.2,2.2 -0.15,2.15 -0.15,1.5 -0.25,1.4 -0.25,0.4 -0.2,0.25
  region: 0.4,0 0.2,0 0.2,0.25 0.25,0.4 0.25,1.4 0.15,1.5 0.15,2.15 0.2,2.2 0.4,2.2 0.45,2.15 0.45,1.5 0.35,1.4 0.35,0.4 0.4,0.25
  region: 1,0 0.8,0 0.8,0.25 0.85,0.4 0.85,1.4 0.75,1.5 0.75,2.15 0.8,2.2 1,2.2 1.05,2.15 1.05,1.5 0.95,1.4 0.95,0.4 1,0.25
  region: 1.6,0 1.4,0 1.4,0.25 1.45,0.4 1.45,1.4 1.35,1.5 1.35,2.15 1.4,2.2 1.6,2.2 1.65,2.15 1.65,1.5 1.55,1.4 1.55,0.4 1.6,0.25
  region: 2.2,0 2,0 2,0.25 2.05,0.4 2.05,1.4 1.95,1.5 1.95,2.15 2,2.2 2.2,2.2 2.25,2.15 2.25,1.5 2.15,1.4 2.15,0.4 2.2,0.25
  region: 2.8,0 2.6,0 2.6,0.25 2.65,0.4 2.65,1.4 2.55,1.5 2.55,2.15 2.6,2.2 2.8,2.2 2.85,2.15 2.85,1.5 2.75,1.4 2.75,0.4 2.8,0.25
  region: -5,0 -5.2,0 -5.2,0.25 -5.15,0.4 -5.15,1.4 -5.25,1.5 -5.25,2.15 -5.2,2.2 -5,2.2 -4.95,2.15 -4.95,1.5 -5.05,1.4 -5.05,0.4 -5,0.25
  region: -4.4,0 -4.6,0 -4.6,0.25 -4.55,0.4 -4.55,1.4 -4.65,1.5 -4.65,2.15 -4.6,2.2 -4.4,2.2 -4.35,2.15 -4.35,1.5 -4.45,1.4 -4.45,0.4 -4.4,0.25
  region: -3.8,0 -4,0 -4,0.25 -3.95,0.4 -3.95,1.4 -4.05,1.5 -4.05,2.15 -4,2.2 -3.8,2.2 -3.75,2.15 -3.75,1.5 -3.85,1.4 -3.85,0.4 -3.8,0.25
  region: -3.2,0 -3.4,0 -3.4,0.25 -3.35,0.4 -3.35,1.4 -3.45,1.5 -3.45,2.15 -3.4,2.2 -3.2,2.2 -3.15,2.15 -3.15,1.5 -3.25,1.4 -3.25,0.4 -3.2,0.25
  region: -2.6,0 -2.8,0 -2.8,0.25 -2.75,0.4 -2.75,1.4 -2.85,1.5 -2.85,2.15 -2.8,2.2 -2.6,2.2 -2.55,2.15 -2.55,1.5 -2.65,1.4 -2.65,0.4 -2.6,0.25
  region: -2,0 -2.2,0 -2.2,0.25 -2.15,0.4 -2.15,1.4 -2.25,1.5 -2.25,2.15 -2.2,2.2 -2,2.2 -1.95,2.15 -1.95,1.5 -2.05,1.4 -2.05,0.4 -2,0.25
  region: -1.4,0 -1.6,0 -1.6,0.25 -1.55,0.4 -1.55,1.4 -1.65,1.5 -1.65,2.15 -1.6,2.2 -1.4,2.2 -1.35,2.15 -1.35,1.5 -1.45,1.4 -1.45,0.4 -1.4,0.25
  region: -5.6,0 -5.8,0 -5.8,0.25 -5.75,0.4 -5.75,1.4 -5.85,1.5 -5.85,2.15 -5.8,2.2 -5.6,2.2 -5.55,2.15 -5.55,1.5 -5.65,1.4 -5.65,0.4 -5.6,0.25
  region: -6.2,0 -6.4,0 -6.4,0.25 -6.35,0.4 -6.35,1.4 -6.45,1.5 -6.45,2.15 -6.4,2.2 -6.2,2.2 -6.15,2.15 -6.15,1.5 -6.25,1.4 -6.25,0.4 -6.2,0.25
  region: -6.8,0 -7,0 -7,0.25 -6.95,0.4 -6.95,1.4 -7.05,1.5 -7.05,2.15 -7,2.2 -6.8,2.2 -6.75,2.15 -6.75,1.5 -6.85,1.4 -6.85,0.4 -6.8,0.25
  region: 6.5,0 6.5,0.3 6.45,0.45 6.45,1.35 6.55,1.45 6.55,1.8 6.575,1.825 6.625,1.825 6.65,1.8 6.65,1.45 6.75,1.35 6.75,0.45 6.7,0.3 6.7,0
  region: 5.9,0 5.9,0.3 5.85,0.45 5.85,1.35 5.95,1.45 5.95,1.8 5.975,1.825 6.025,1.825 6.05,1.8 6.05,1.45 6.15,1.35 6.15,0.45 6.1,0.3 6.1,0
  region: 5.3,0 5.3,0.3 5.25,0.45 5.25,1.35 5.35,1.45 5.35,1.8 5.375,1.825 5.425,1.825 5.45,1.8 5.45,1.45 5.55,1.35 5.55,0.45 5.5,0.3 5.5,0
  region: 4.7,0 4.7,0.3 4.65,0.45 4.65,1.35 4.75,1.45 4.75,1.8 4.775,1.825 4.825,1.825 4.85,1.8 4.85,1.45 4.95,1.35 4.95,0.45 4.9,0.3 4.9,0
  region: 4.1,0 4.1,0.3 4.05,0.45 4.05,1.35 4.15,1.45 4.15,1.8 4.175,1.825 4.225,1.825 4.25,1.8 4.25,1.45 4.35,1.35 4.35,0.45 4.3,0.3 4.3,0
  region: 3.5,0 3.5,0.3 3.45,0.45 3.45,1.35 3.55,1.45 3.55,1.8 3.575,1.825 3.625,1.825 3.65,1.8 3.65,1.45 3.75,1.35 3.75,0.45 3.7,0.3 3.7,0
  region: 2.9,0 2.9,0.3 2.85,0.45 2.85,1.35 2.95,1.45 2.95,1.8 2.975,1.825 3.025,1.825 3.05,1.8 3.05,1.45 3.15,1.35 3.15,0.45 3.1,0.3 3.1,0
  region: -1.9,0 -1.9,0.3 -1.95,0.45 -1.95,1.35 -1.85,1.45 -1.85,1.8 -1.825,1.825 -1.775,1.825 -1.75,1.8 -1.75,1.45 -1.65,1.35 -1.65,0.45 -1.7,0.3 -1.7,0
  region: -1.3,0 -1.3,0.3 -1.35,0.45 -1.35,1.35 -1.25,1.45 -1.25,1.8 -1.225,1.825 -1.175,1.825 -1.15,1.8 -1.15,1.45 -1.05,1.35 -1.05,0.45 -1.1,0.3 -1.1,0
  region: -0.7,0 -0.7,0.3 -0.75,0.45 -0.75,1.35 -0.65,1.45 -0.65,1.8 -0.625,1.825 -0.575,1.825 -0.55,1.8 -0.55,1.45 -0.45,1.35 -0.45,0.45 -0.5,0.3 -0.5,0
  region: -0.1,0 -0.1,0.3 -0.15,0.45 -0.15,1.35 -0.05,1.45 -0.05,1.8 -0.025,1.825 0.025,1.825 0.05,1.8 0.05,1.45 0.15,1.35 0.15,0.45 0.1,0.3 0.1,0
  region: 0.5,0 0.5,0.3 0.45,0.45 0.45,1.35 0.55,1.45 0.55,1.8 0.575,1.825 0.625,1.825 0.65,1.8 0.65,1.45 0.75,1.35 0.75,0.45 0.7,0.3 0.7,0
  region: 1.1,0 1.1,0.3 1.05,0.45 1.05,1.35 1.15,1.45 1.15,1.8 1.175,1.825 1.225,1.825 1.25,1.8 1.25,1.45 1.35,1.35 1.35,0.45 1.3,0.3 1.3,0
  region: 1.7,0 1.7,0.3 1.65,0.45 1.65,1.35 1.75,1.45 1.75,1.8 1.775,1.825 1.825,1.825 1.85,1.8 1.85,1.45 1.95,1.35 1.95,0.45 1.9,0.3 1.9,0
  region: 2.3,0 2.3,0.3 2.25,0.45 2.25,1.35 2.35,1.45 2.35,1.8 2.375,1.825 2.425,1.825 2.45,1.8 2.45,1.45 2.55,1.35 2.55,0.45 2.5,0.3 2.5,0
  region: -6.7,0 -6.7,0.3 -6.75,0.45 -6.75,1.35 -6.65,1.45 -6.65,1.8 -6.625,1.825 -6.575,1.825 -6.55,1.8 -6.55,1.45 -6.45,1.35 -6.45,0.45 -6.5,0.3 -6.5,0
  region: -6.1,0 -6.1,0.3 -6.15,0.45 -6.15,1.35 -6.05,1.45 -6.05,1.8 -6.025,1.825 -5.975,1.825 -5.95,1.8 -5.95,1.45 -5.85,1.35 -5.85,0.45 -5.9,0.3 -5.9,0
  region: -5.5,0 -5.5,0.3 -5.55,0.45 -5.55,1.35 -5.45,1.45 -5.45,1.8 -5.425,1.825 -5.375,1.825 -5.35,1.8 -5.35,1.45 -5.25,1.35 -5.25,0.45 -5.3,0.3 -5.3,0
  region: -4.9,0 -4.9,0.3 -4.95,0.45 -4.95,1.35 -4.85,1.45 -4.85,1.8 -4.825,1.825 -4.775,1.825 -4.75,1.8 -4.75,1.45 -4.65,1.35 -4.65,0.45 -4.7,0.3 -4.7,0
  region: -4.3,0 -4.3,0.3 -4.35,0.45 -4.35,1.35 -4.25,1.45 -4.25,1.8 -4.225,1.825 -4.175,1.825 -4.15,1.8 -4.15,1.45 -4.05,1.35 -4.05,0.45 -4.1,0.3 -4.1,0
  region: -3.7,0 -3.7,0.3 -3.75,0.45 -3.75,1.35 -3.65,1.45 -3.65,1.8 -3.625,1.825 -3.575,1.825 -3.55,1.8 -3.55,1.45 -3.45,1.35 -3.45,0.45 -3.5,0.3 -3.5,0
  region: -3.1,0 -3.1,0.3 -3.15,0.45 -3.15,1.35 -3.05,1.45 -3.05,1.8 -3.025,1.825 -2.975,1.825 -2.95,1.8 -2.95,1.45 -2.85,1.35 -2.85,0.45 -2.9,0.3 -2.9,0
  region: -2.5,0 -2.5,0.3 -2.55,0.45 -2.55,1.35 -2.45,1.45 -2.45,1.8 -2.425,1.825 -2.375,1.825 -2.35,1.8 -2.35,1.45 -2.25,1.35 -2.25,0.45 -2.3,0.3 -2.3,0
  region: -7.3,0 -7.3,0.3 -7.35,0.45 -7.35,1.35 -7.25,1.45 -7.25,1.8 -7.225,1.825 -7.175,1.825 -7.15,1.8 -7.15,1.45 -7.05,1.35 -7.05,0.45 -7.1,0.3 -7.1,0
  lines w0.2: -7.2,-0.5 -7.2,0 ; -6.9,-0.5 -6.9,0 ; -6.6,-0.5 -6.6,0 ; -6.3,-0.5 -6.3,0 ; -6,-0.5 -6,0 ; -5.7,-0.5 -5.7,0 ; -5.4,-0.5 -5.4,0 ; -5.1,-0.5 -5.1,0 ; -4.8,-0.5 -4.8,0 ; -4.5,-0.5 -4.5,0 ; -4.2,-0.5 -4.2,0 ; -3.9,-0.5 -3.9,0 ; -3.6,-0.5 -3.6,0 ; -3.3,-0.5 -3.3,0 ; -3,-0.5 -3,0 ; -2.7,-0.5 -2.7,0 ; -2.4,-0.5 -2.4,0 ; -2.1,-0.5 -2.1,0 ; -1.8,-0.5 -1.8,0 ; -1.5,-0.5 -1.5,0 ; -1.2,-0.5 -1.2,0 ; -0.9,-0.5 -0.9,0 ; -0.6,-0.5 -0.6,0 ; -0.3,-0.5 -0.3,0 ; 0,-0.5 0,0 ; 0.3,-0.5 0.3,0 ; 0.6,-0.5 0.6,0 ; 0.9,-0.5 0.9,0 ; 1.2,-0.5 1.2,0 ; 1.5,-0.5 1.5,0 ; 1.8,-0.5 1.8,0 ; 2.1,-0.5 2.1,0 ; 2.4,-0.5 2.4,0 ; 2.7,-0.5 2.7,0 ; 3,-0.5 3,0 ; 3.3,-0.5 3.3,0 ; 3.6,-0.5 3.6,0 ; 3.9,-0.5 3.9,0 ; 4.2,-0.5 4.2,0 ; 4.5,-0.5 4.5,0 ; 4.8,-0.5 4.8,0 ; 5.1,-0.5 5.1,0 ; 5.4,-0.5 5.4,0 ; 5.7,-0.5 5.7,0 ; 6,-0.5 6,0 ; 6.3,-0.5 6.3,0 ; 6.6,-0.5 6.6,0 ; 6.9,-0.5 6.9,0 ; 7.2,-0.5 7.2,0
  lines w0.254: -7.525,-0.5 -7.525,0 ; 7.525,-0.5 7.525,0
Top Solder:
  rectangle: -7.8,0 7.8,2.5